# Altium footprint library Circuitos Integrados.PcbLib: 81 footprints (part 6 of 6)
Each footprint in its own frame and in the unit in brackets; x right, y up, seen from the top. Pads: shape width x height; smd on the part's side, far side on the other; paste and mask are expansions set on the pad; w line width, h text height; cw(c..) or ccw(c..) is an arc to the next point about the centre after c.
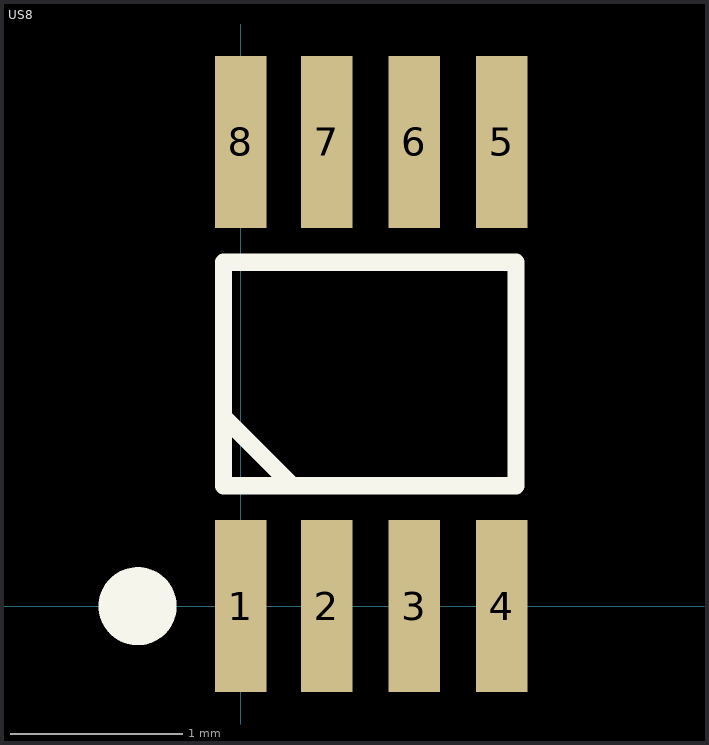
[diagram p5: the footprint, top view; thin cyan lines are the x and y axes]

## US8 [mm]
pads (8):
  rect 0.3x1 smd: 1(0,0) 2(0.5,0) 3(1.008,0) 4(1.516,0) 5(1.516,2.7) 6(1.008,2.7) 7(0.5,2.7) 8(0,2.7)
Top Overlay:
  circle w0.254: c-0.6,0 r0.1
  lines w0.1: -0.1,1.1 0.3,0.7 ; -0.1,0.7 -0.1,2 1.6,2 1.6,0.7 -0.1,0.7
3D body "User Library-SOP50P310X90-8N[8US8_VSSOP_DCU_MO-187CA].step": height 0.9, standoff 0, extent -0.3,-0.275 1.8,2.925